# Altium footprint library ref-packages.PCBLIB: 1543 footprints (part 96 of 103) (continued)
## TQFP100 [mm]
pads (100):
  rect 0.27x1.5 smd: 1(-6,-7.75) 2(-5.5,-7.75) 3(-5,-7.75) 4(-4.5,-7.75) 5(-4,-7.75) 6(-3.5,-7.75) 7(-3,-7.75) 8(-2.5,-7.75) 9(-2,-7.75) 10(-1.5,-7.75) 11(-1,-7.75) 12(-0.5,-7.75) 13(0,-7.75) 14(0.5,-7.75) 15(1,-7.75) 16(1.5,-7.75) 17(2,-7.75) 18(2.5,-7.75) 19(3,-7.75) 20(3.5,-7.75) 21(4,-7.75) 22(4.5,-7.75) 23(5,-7.75) 24(5.5,-7.75) 25(6,-7.75) 51(6,7.75) 52(5.5,7.75) 53(5,7.75) 54(4.5,7.75) 55(4,7.75) 56(3.5,7.75) 57(3,7.75) 58(2.5,7.75) 59(2,7.75) 60(1.5,7.75) 61(1,7.75) 62(0.5,7.75) 63(0,7.75) 64(-0.5,7.75) 65(-1,7.75) 66(-1.5,7.75) 67(-2,7.75) 68(-2.5,7.75) 69(-3,7.75) 70(-3.5,7.75) 71(-4,7.75) 72(-4.5,7.75) 73(-5,7.75) 74(-5.5,7.75) 75(-6,7.75)
  rect 1.5x0.27 smd: 26(7.75,-6) 27(7.75,-5.5) 28(7.75,-5) 29(7.75,-4.5) 30(7.75,-4) 31(7.75,-3.5) 32(7.75,-3) 33(7.75,-2.5) 34(7.75,-2) 35(7.75,-1.5) 36(7.75,-1) 37(7.75,-0.5) 38(7.75,0) 39(7.75,0.5) 40(7.75,1) 41(7.75,1.5) 42(7.75,2) 43(7.75,2.5) 44(7.75,3) 45(7.75,3.5) 46(7.75,4) 47(7.75,4.5) 48(7.75,5) 49(7.75,5.5) 50(7.75,6) 76(-7.75,6) 77(-7.75,5.5) 78(-7.75,5) 79(-7.75,4.5) 80(-7.75,4) 81(-7.75,3.5) 82(-7.75,3) 83(-7.75,2.5) 84(-7.75,2) 85(-7.75,1.5) 86(-7.75,1) 87(-7.75,0.5) 88(-7.75,0) 89(-7.75,-0.5) 90(-7.75,-1) 91(-7.75,-1.5) 92(-7.75,-2) 93(-7.75,-2.5) 94(-7.75,-3) 95(-7.75,-3.5) 96(-7.75,-4) 97(-7.75,-4.5) 98(-7.75,-5) 99(-7.75,-5.5) 100(-7.75,-6)
Top Overlay:
  circle w0.152: c-4.5,-4.5 r1
  lines w0.152: -6.873,-6.123 -6.123,-6.873 6.873,-6.873 6.873,6.873 -6.873,6.873 -6.873,-6.123
Mechanical 16:
  rectangle: -6.135,6.868 -5.865,7.873
  rectangle: -5.635,6.868 -5.365,7.873
  rectangle: -5.135,6.868 -4.865,7.873
  rectangle: -4.635,6.868 -4.365,7.873
  rectangle: -4.135,6.868 -3.865,7.873
  rectangle: -3.635,6.868 -3.365,7.873
  rectangle: -3.135,6.868 -2.865,7.873
  rectangle: -2.635,6.868 -2.365,7.873
  rectangle: -2.135,6.868 -1.865,7.873
  rectangle: -1.635,6.868 -1.365,7.873
  rectangle: -1.135,6.868 -0.865,7.873
  rectangle: -0.635,6.868 -0.365,7.873
  rectangle: -0.135,6.868 0.135,7.873
  rectangle: 0.365,6.868 0.635,7.873
  rectangle: 0.865,6.868 1.135,7.873
  rectangle: 1.365,6.868 1.635,7.873
  rectangle: 1.865,6.868 2.135,7.873
  rectangle: 2.365,6.868 2.635,7.873
  rectangle: 2.865,6.868 3.135,7.873
  rectangle: 3.365,6.868 3.635,7.873
  rectangle: 3.865,6.868 4.135,7.873
  rectangle: 4.365,6.868 4.635,7.873
  rectangle: 4.865,6.868 5.135,7.873
  rectangle: 5.365,6.868 5.635,7.873
  rectangle: 5.865,6.868 6.135,7.873
  rectangle: 6.873,5.865 7.878,6.135
  rectangle: 6.873,5.365 7.878,5.635
  rectangle: 6.873,4.865 7.878,5.135
  rectangle: 6.873,4.365 7.878,4.635
  rectangle: 6.873,3.865 7.878,4.135
  rectangle: 6.873,3.365 7.878,3.635
  rectangle: 6.873,2.865 7.878,3.135
  rectangle: 6.873,2.365 7.878,2.635
  rectangle: 6.873,1.865 7.878,2.135
  rectangle: 6.873,1.365 7.878,1.635
  rectangle: 6.873,0.865 7.878,1.135
  rectangle: 6.873,0.365 7.878,0.635
  rectangle: 6.873,-0.135 7.878,0.135
  rectangle: 6.873,-0.635 7.878,-0.365
  rectangle: 6.873,-1.135 7.878,-0.865
  rectangle: 6.873,-1.635 7.878,-1.365
  rectangle: 6.873,-2.135 7.878,-1.865
  rectangle: 6.873,-2.635 7.878,-2.365
  rectangle: 6.873,-3.135 7.878,-2.865
  rectangle: 6.873,-3.635 7.878,-3.365
  rectangle: 6.873,-4.135 7.878,-3.865
  rectangle: 6.873,-4.635 7.878,-4.365
  rectangle: 6.873,-5.135 7.878,-4.865
  rectangle: 6.873,-5.635 7.878,-5.365
  rectangle: 6.873,-6.135 7.878,-5.865
  rectangle: 5.865,-7.873 6.135,-6.868
  rectangle: 5.365,-7.873 5.635,-6.868
  rectangle: 4.865,-7.873 5.135,-6.868
  rectangle: 4.365,-7.873 4.635,-6.868
  rectangle: 3.865,-7.873 4.135,-6.868
  rectangle: 3.365,-7.873 3.635,-6.868
  rectangle: 2.865,-7.873 3.135,-6.868
  rectangle: 2.365,-7.873 2.635,-6.868
  rectangle: 1.865,-7.873 2.135,-6.868
  rectangle: 1.365,-7.873 1.635,-6.868
  rectangle: 0.865,-7.873 1.135,-6.868
  rectangle: 0.365,-7.873 0.635,-6.868
  rectangle: -0.135,-7.873 0.135,-6.868
  rectangle: -0.635,-7.873 -0.365,-6.868
  rectangle: -1.135,-7.873 -0.865,-6.868
  rectangle: -1.635,-7.873 -1.365,-6.868
  rectangle: -2.135,-7.873 -1.865,-6.868
  rectangle: -2.635,-7.873 -2.365,-6.868
  rectangle: -3.135,-7.873 -2.865,-6.868
  rectangle: -3.635,-7.873 -3.365,-6.868
  rectangle: -4.135,-7.873 -3.865,-6.868
  rectangle: -4.635,-7.873 -4.365,-6.868
  rectangle: -5.135,-7.873 -4.865,-6.868
  rectangle: -5.635,-7.873 -5.365,-6.868
  rectangle: -6.135,-7.873 -5.865,-6.868
  rectangle: -7.878,-6.135 -6.873,-5.865
  rectangle: -7.878,-5.635 -6.873,-5.365
  rectangle: -7.878,-5.135 -6.873,-4.865
  rectangle: -7.878,-4.635 -6.873,-4.365
  rectangle: -7.878,-4.135 -6.873,-3.865
  rectangle: -7.878,-3.635 -6.873,-3.365
  rectangle: -7.878,-3.135 -6.873,-2.865
  rectangle: -7.878,-2.635 -6.873,-2.365
  rectangle: -7.878,-2.135 -6.873,-1.865
  rectangle: -7.878,-1.635 -6.873,-1.365
  rectangle: -7.878,-1.135 -6.873,-0.865
  rectangle: -7.878,-0.635 -6.873,-0.365
  rectangle: -7.878,-0.135 -6.873,0.135
  rectangle: -7.878,0.365 -6.873,0.635
  rectangle: -7.878,0.865 -6.873,1.135
  rectangle: -7.878,1.365 -6.873,1.635
  rectangle: -7.878,1.865 -6.873,2.135
  rectangle: -7.878,2.365 -6.873,2.635
  rectangle: -7.878,2.865 -6.873,3.135
  rectangle: -7.878,3.365 -6.873,3.635
  rectangle: -7.878,3.865 -6.873,4.135
  rectangle: -7.878,4.365 -6.873,4.635
  rectangle: -7.878,4.865 -6.873,5.135
  rectangle: -7.878,5.365 -6.873,5.635
  rectangle: -7.878,5.865 -6.873,6.135

## TQFP112 [mm]
pads (112):
  rect 1.5x0.37 smd: 1(-10.75,8.775) 2(-10.75,8.125) 3(-10.75,7.475) 4(-10.75,6.825) 5(-10.75,6.175) 6(-10.75,5.525) 7(-10.75,4.875) 8(-10.75,4.225) 9(-10.75,3.575) 10(-10.75,2.925) 11(-10.75,2.275) 12(-10.75,1.625) 13(-10.75,0.975) 14(-10.75,0.325) 15(-10.75,-0.325) 16(-10.75,-0.975) 17(-10.75,-1.625) 18(-10.75,-2.275) 19(-10.75,-2.925) 20(-10.75,-3.575) 21(-10.75,-4.225) 22(-10.75,-4.875) 23(-10.75,-5.525) 24(-10.75,-6.175) 25(-10.75,-6.825) 26(-10.75,-7.475) 27(-10.75,-8.125) 28(-10.75,-8.775) 57(10.75,-8.775) 58(10.75,-8.125) 59(10.75,-7.475) 60(10.75,-6.825) 61(10.75,-6.175) 62(10.75,-5.525) 63(10.75,-4.875) 64(10.75,-4.225) 65(10.75,-3.575) 66(10.75,-2.925) 67(10.75,-2.275) 68(10.75,-1.625) 69(10.75,-0.975) 70(10.75,-0.325) 71(10.75,0.325) 72(10.75,0.975) 73(10.75,1.625) 74(10.75,2.275) 75(10.75,2.925) 76(10.75,3.575) 77(10.75,4.225) 78(10.75,4.875) 79(10.75,5.525) 80(10.75,6.175) 81(10.75,6.825) 82(10.75,7.475) 83(10.75,8.125) 84(10.75,8.775)
  rect 0.37x1.5 smd: 29(-8.775,-10.75) 30(-8.125,-10.75) 31(-7.475,-10.75) 32(-6.825,-10.75) 33(-6.175,-10.75) 34(-5.525,-10.75) 35(-4.875,-10.75) 36(-4.225,-10.75) 37(-3.575,-10.75) 38(-2.925,-10.75) 39(-2.275,-10.75) 40(-1.625,-10.75) 41(-0.975,-10.75) 42(-0.325,-10.75) 43(0.325,-10.75) 44(0.975,-10.75) 45(1.625,-10.75) 46(2.275,-10.75) 47(2.925,-10.75) 48(3.575,-10.75) 49(4.225,-10.75) 50(4.875,-10.75) 51(5.525,-10.75) 52(6.175,-10.75) 53(6.825,-10.75) 54(7.475,-10.75) 55(8.125,-10.75) 56(8.775,-10.75) 85(8.775,10.75) 86(8.125,10.75) 87(7.475,10.75) 88(6.825,10.75) 89(6.175,10.75) 90(5.525,10.75) 91(4.875,10.75) 92(4.225,10.75) 93(3.575,10.75) 94(2.925,10.75) 95(2.275,10.75) 96(1.625,10.75) 97(0.975,10.75) 98(0.325,10.75) 99(-0.325,10.75) 100(-0.975,10.75) 101(-1.625,10.75) 102(-2.275,10.75) 103(-2.925,10.75) 104(-3.575,10.75) 105(-4.225,10.75) 106(-4.875,10.75) 107(-5.525,10.75) 108(-6.175,10.75) 109(-6.825,10.75) 110(-7.475,10.75) 111(-8.125,10.75) 112(-8.775,10.75)
Top Overlay:
  circle w0.203: c-8.5,8.4 r0.6
  lines w0.203: -9.8,-9.4 -9.8,9.4 -9.4,9.8 9.4,9.8 9.8,9.4 9.8,-9.4 9.4,-9.8 -9.4,-9.8 -9.8,-9.4
Mechanical 16:
  rectangle: -11.05,8.612 -9.88,8.937
  rectangle: -11.05,7.962 -9.88,8.288
  rectangle: -11.05,7.312 -9.88,7.638
  rectangle: -11.05,6.662 -9.88,6.988
  rectangle: -11.05,6.012 -9.88,6.338
  rectangle: -11.05,5.362 -9.88,5.688
  rectangle: -11.05,4.712 -9.88,5.038
  rectangle: -11.05,4.062 -9.88,4.388
  rectangle: -11.05,3.412 -9.88,3.738
  rectangle: -11.05,2.763 -9.88,3.088
  rectangle: -11.05,2.113 -9.88,2.437
  rectangle: -11.05,1.463 -9.88,1.787
  rectangle: -11.05,0.813 -9.88,1.137
  rectangle: -11.05,0.163 -9.88,0.487
  rectangle: -11.05,-0.487 -9.88,-0.163
  rectangle: -11.05,-1.137 -9.88,-0.813
  rectangle: -11.05,-1.787 -9.88,-1.463
  rectangle: -11.05,-2.437 -9.88,-2.113
  rectangle: -11.05,-3.088 -9.88,-2.763
  rectangle: -11.05,-3.738 -9.88,-3.412
  rectangle: -11.05,-4.388 -9.88,-4.062
  rectangle: -11.05,-5.038 -9.88,-4.712
  rectangle: -11.05,-5.688 -9.88,-5.362
  rectangle: -11.05,-6.338 -9.88,-6.012
  rectangle: -11.05,-6.988 -9.88,-6.662
  rectangle: -11.05,-7.638 -9.88,-7.312
  rectangle: -11.05,-8.288 -9.88,-7.962
  rectangle: -11.05,-8.937 -9.88,-8.612
  rectangle: -8.937,-11.05 -8.612,-9.88
  rectangle: -8.288,-11.05 -7.962,-9.88
  rectangle: -7.638,-11.05 -7.312,-9.88
  rectangle: -6.988,-11.05 -6.662,-9.88
  rectangle: -6.338,-11.05 -6.012,-9.88
  rectangle: -5.688,-11.05 -5.362,-9.88
  rectangle: -5.038,-11.05 -4.712,-9.88
  rectangle: -4.388,-11.05 -4.062,-9.88
  rectangle: -3.738,-11.05 -3.412,-9.88
  rectangle: -3.088,-11.05 -2.763,-9.88
  rectangle: -2.437,-11.05 -2.113,-9.88
  rectangle: -1.787,-11.05 -1.463,-9.88
  rectangle: -1.137,-11.05 -0.813,-9.88
  rectangle: -0.487,-11.05 -0.163,-9.88
  rectangle: 0.163,-11.05 0.487,-9.88
  rectangle: 0.813,-11.05 1.137,-9.88
  rectangle: 1.463,-11.05 1.787,-9.88
  rectangle: 2.113,-11.05 2.437,-9.88
  rectangle: 2.763,-11.05 3.088,-9.88
  rectangle: 3.412,-11.05 3.738,-9.88
  rectangle: 4.062,-11.05 4.388,-9.88
  rectangle: 4.712,-11.05 5.038,-9.88
  rectangle: 5.362,-11.05 5.688,-9.88
  rectangle: 6.012,-11.05 6.338,-9.88
  rectangle: 6.662,-11.05 6.988,-9.88
  rectangle: 7.312,-11.05 7.638,-9.88
  rectangle: 7.962,-11.05 8.288,-9.88
  rectangle: 8.612,-11.05 8.937,-9.88
  rectangle: 9.88,-8.937 11.05,-8.612
  rectangle: 9.88,-8.288 11.05,-7.962
  rectangle: 9.88,-7.638 11.05,-7.312
  rectangle: 9.88,-6.988 11.05,-6.662
  rectangle: 9.88,-6.338 11.05,-6.012
  rectangle: 9.88,-5.688 11.05,-5.362
  rectangle: 9.88,-5.038 11.05,-4.712
  rectangle: 9.88,-4.388 11.05,-4.062
  rectangle: 9.88,-3.738 11.05,-3.412
  rectangle: 9.88,-3.088 11.05,-2.763
  rectangle: 9.88,-2.437 11.05,-2.113
  rectangle: 9.88,-1.787 11.05,-1.463
  rectangle: 9.88,-1.137 11.05,-0.813
  rectangle: 9.88,-0.487 11.05,-0.163
  rectangle: 9.88,0.163 11.05,0.487
  rectangle: 9.88,0.813 11.05,1.137
  rectangle: 9.88,1.463 11.05,1.787
  rectangle: 9.88,2.113 11.05,2.437
  rectangle: 9.88,2.763 11.05,3.088
  rectangle: 9.88,3.412 11.05,3.738
  rectangle: 9.88,4.062 11.05,4.388
  rectangle: 9.88,4.712 11.05,5.038
  rectangle: 9.88,5.362 11.05,5.688
  rectangle: 9.88,6.012 11.05,6.338
  rectangle: 9.88,6.662 11.05,6.988
  rectangle: 9.88,7.312 11.05,7.638
  rectangle: 9.88,7.962 11.05,8.288
  rectangle: 9.88,8.612 11.05,8.937
  rectangle: 8.612,9.88 8.937,11.05
  rectangle: 7.962,9.88 8.288,11.05
  rectangle: 7.312,9.88 7.638,11.05
  rectangle: 6.662,9.88 6.988,11.05
  rectangle: 6.012,9.88 6.338,11.05
  rectangle: 5.362,9.88 5.688,11.05
  rectangle: 4.712,9.88 5.038,11.05
  rectangle: 4.062,9.88 4.388,11.05
  rectangle: 3.412,9.88 3.738,11.05
  rectangle: 2.763,9.88 3.088,11.05
  rectangle: 2.113,9.88 2.437,11.05
  rectangle: 1.463,9.88 1.787,11.05
  rectangle: 0.813,9.88 1.137,11.05
  rectangle: 0.163,9.88 0.487,11.05
  rectangle: -0.487,9.88 -0.163,11.05
  rectangle: -1.137,9.88 -0.813,11.05
  rectangle: -1.787,9.88 -1.463,11.05
  rectangle: -2.437,9.88 -2.113,11.05
  rectangle: -3.088,9.88 -2.763,11.05
  rectangle: -3.738,9.88 -3.412,11.05
  rectangle: -4.388,9.88 -4.062,11.05
  rectangle: -5.038,9.88 -4.712,11.05
  rectangle: -5.688,9.88 -5.362,11.05
  rectangle: -6.338,9.88 -6.012,11.05
  rectangle: -6.988,9.88 -6.662,11.05
  rectangle: -7.638,9.88 -7.312,11.05
  rectangle: -8.288,9.88 -7.962,11.05
  rectangle: -8.937,9.88 -8.612,11.05

## TQFP128 [mm]
pads (128):
  rect 0.27x1.5 smd: 1(-7.75,-10.75) 2(-7.25,-10.75) 3(-6.75,-10.75) 4(-6.25,-10.75) 5(-5.75,-10.75) 6(-5.25,-10.75) 7(-4.75,-10.75) 8(-4.25,-10.75) 9(-3.75,-10.75) 10(-3.25,-10.75) 11(-2.75,-10.75) 12(-2.25,-10.75) 13(-1.75,-10.75) 14(-1.25,-10.75) 15(-0.75,-10.75) 16(-0.25,-10.75) 17(0.25,-10.75) 18(0.75,-10.75) 19(1.25,-10.75) 20(1.75,-10.75) 21(2.25,-10.75) 22(2.75,-10.75) 23(3.25,-10.75) 24(3.75,-10.75) 25(4.25,-10.75) 26(4.75,-10.75) 27(5.25,-10.75) 28(5.75,-10.75) 29(6.25,-10.75) 30(6.75,-10.75) 31(7.25,-10.75) 32(7.75,-10.75) 65(7.75,10.75) 66(7.25,10.75) 67(6.75,10.75) 68(6.25,10.75) 69(5.75,10.75) 70(5.25,10.75) 71(4.75,10.75) 72(4.25,10.75) 73(3.75,10.75) 74(3.25,10.75) 75(2.75,10.75) 76(2.25,10.75) 77(1.75,10.75) 78(1.25,10.75) 79(0.75,10.75) 80(0.25,10.75) 81(-0.25,10.75) 82(-0.75,10.75) 83(-1.25,10.75) 84(-1.75,10.75) 85(-2.25,10.75) 86(-2.75,10.75) 87(-3.25,10.75) 88(-3.75,10.75) 89(-4.25,10.75) 90(-4.75,10.75) 91(-5.25,10.75) 92(-5.75,10.75) 93(-6.25,10.75) 94(-6.75,10.75) 95(-7.25,10.75) 96(-7.75,10.75)
  rect 1.5x0.27 smd: 33(10.75,-7.75) 34(10.75,-7.25) 35(10.75,-6.75) 36(10.75,-6.25) 37(10.75,-5.75) 38(10.75,-5.25) 39(10.75,-4.75) 40(10.75,-4.25) 41(10.75,-3.75) 42(10.75,-3.25) 43(10.75,-2.75) 44(10.75,-2.25) 45(10.75,-1.75) 46(10.75,-1.25) 47(10.75,-0.75) 48(10.75,-0.25) 49(10.75,0.25) 50(10.75,0.75) 51(10.75,1.25) 52(10.75,1.75) 53(10.75,2.25) 54(10.75,2.75) 55(10.75,3.25) 56(10.75,3.75) 57(10.75,4.25) 58(10.75,4.75) 59(10.75,5.25) 60(10.75,5.75) 61(10.75,6.25) 62(10.75,6.75) 63(10.75,7.25) 64(10.75,7.75) 97(-10.75,7.75) 98(-10.75,7.25) 99(-10.75,6.75) 100(-10.75,6.25) 101(-10.75,5.75) 102(-10.75,5.25) 103(-10.75,4.75) 104(-10.75,4.25) 105(-10.75,3.75) 106(-10.75,3.25) 107(-10.75,2.75) 108(-10.75,2.25) 109(-10.75,1.75) 110(-10.75,1.25) 111(-10.75,0.75) 112(-10.75,0.25) 113(-10.75,-0.25) 114(-10.75,-0.75) 115(-10.75,-1.25) 116(-10.75,-1.75) 117(-10.75,-2.25) 118(-10.75,-2.75) 119(-10.75,-3.25) 120(-10.75,-3.75) 121(-10.75,-4.25) 122(-10.75,-4.75) 123(-10.75,-5.25) 124(-10.75,-5.75) 125(-10.75,-6.25) 126(-10.75,-6.75) 127(-10.75,-7.25) 128(-10.75,-7.75)
Top Overlay:
  circle w0.152: c-7.5,-7.5 r1
  lines w0.152: -9.873,-8.873 -8.873,-9.873 9.873,-9.873 9.873,9.873 -9.873,9.873 -9.873,-8.873
Mechanical 16:
  rectangle: -7.885,9.868 -7.61,10.873
  rectangle: -7.385,9.868 -7.11,10.873
  rectangle: -6.885,9.868 -6.61,10.873
  rectangle: -6.385,9.868 -6.11,10.873
  rectangle: -5.885,9.868 -5.61,10.873
  rectangle: -5.385,9.868 -5.11,10.873
  rectangle: -4.885,9.868 -4.61,10.873
  rectangle: -4.385,9.868 -4.11,10.873
  rectangle: -3.885,9.868 -3.61,10.873
  rectangle: -3.385,9.868 -3.11,10.873
  rectangle: -2.885,9.868 -2.61,10.873
  rectangle: -2.385,9.868 -2.11,10.873
  rectangle: -1.885,9.868 -1.61,10.873
  rectangle: -1.385,9.868 -1.11,10.873
  rectangle: -0.885,9.868 -0.61,10.873
  rectangle: -0.385,9.868 -0.11,10.873
  rectangle: 0.115,9.868 0.39,10.873
  rectangle: 0.615,9.868 0.89,10.873
  rectangle: 1.115,9.868 1.39,10.873
  rectangle: 1.615,9.868 1.89,10.873
  rectangle: 2.115,9.868 2.39,10.873
  rectangle: 2.615,9.868 2.89,10.873
  rectangle: 3.115,9.868 3.39,10.873
  rectangle: 3.615,9.868 3.89,10.873
  rectangle: 4.115,9.868 4.39,10.873
  rectangle: 4.615,9.868 4.89,10.873
  rectangle: 5.115,9.868 5.39,10.873
  rectangle: 5.615,9.868 5.89,10.873
  rectangle: 6.115,9.868 6.39,10.873
  rectangle: 6.615,9.868 6.89,10.873
  rectangle: 7.115,9.868 7.39,10.873
  rectangle: 7.615,9.868 7.89,10.873
  rectangle: 9.873,7.615 10.878,7.89
  rectangle: 9.873,7.115 10.878,7.39
  rectangle: 9.873,6.615 10.878,6.89
  rectangle: 9.873,6.115 10.878,6.39
  rectangle: 9.873,5.615 10.878,5.89
  rectangle: 9.873,5.115 10.878,5.39
  rectangle: 9.873,4.615 10.878,4.89
  rectangle: 9.873,4.115 10.878,4.39
  rectangle: 9.873,3.615 10.878,3.89
  rectangle: 9.873,3.115 10.878,3.39
  rectangle: 9.873,2.615 10.878,2.89
  rectangle: 9.873,2.115 10.878,2.39
  rectangle: 9.873,1.615 10.878,1.89
  rectangle: 9.873,1.115 10.878,1.39
  rectangle: 9.873,0.615 10.878,0.89
  rectangle: 9.873,0.115 10.878,0.39
  rectangle: 9.873,-0.385 10.878,-0.11
  rectangle: 9.873,-0.885 10.878,-0.61
  rectangle: 9.873,-1.385 10.878,-1.11
  rectangle: 9.873,-1.885 10.878,-1.61
  rectangle: 9.873,-2.385 10.878,-2.11
  rectangle: 9.873,-2.885 10.878,-2.61
  rectangle: 9.873,-3.385 10.878,-3.11
  rectangle: 9.873,-3.885 10.878,-3.61
  rectangle: 9.873,-4.385 10.878,-4.11
  rectangle: 9.873,-4.885 10.878,-4.61
  rectangle: 9.873,-5.385 10.878,-5.11
  rectangle: 9.873,-5.885 10.878,-5.61
  rectangle: 9.873,-6.385 10.878,-6.11
  rectangle: 9.873,-6.885 10.878,-6.61
  rectangle: 9.873,-7.385 10.878,-7.11
  rectangle: 9.873,-7.885 10.878,-7.61
  rectangle: -10.873,7.615 -9.868,7.89
  rectangle: -10.873,7.115 -9.868,7.39
  rectangle: -10.873,6.615 -9.868,6.89
  rectangle: -10.873,6.115 -9.868,6.39
  rectangle: -10.873,5.615 -9.868,5.89
  rectangle: -10.873,5.115 -9.868,5.39
  rectangle: -10.873,4.615 -9.868,4.89
  rectangle: -10.873,4.115 -9.868,4.39
  rectangle: -10.873,3.615 -9.868,3.89
  rectangle: -10.873,3.115 -9.868,3.39
  rectangle: -10.873,2.615 -9.868,2.89
  rectangle: -10.873,2.115 -9.868,2.39
  rectangle: -10.873,1.615 -9.868,1.89
  rectangle: -10.873,1.115 -9.868,1.39
  rectangle: -10.873,0.615 -9.868,0.89
  rectangle: -10.873,0.115 -9.868,0.39
  rectangle: -10.873,-0.385 -9.868,-0.11
  rectangle: -10.873,-0.885 -9.868,-0.61
  rectangle: -10.873,-1.385 -9.868,-1.11
  rectangle: -10.873,-1.885 -9.868,-1.61
  rectangle: -10.873,-2.385 -9.868,-2.11
  rectangle: -10.873,-2.885 -9.868,-2.61
  rectangle: -10.873,-3.385 -9.868,-3.11
  rectangle: -10.873,-3.885 -9.868,-3.61
  rectangle: -10.873,-4.385 -9.868,-4.11
  rectangle: -10.873,-4.885 -9.868,-4.61
  rectangle: -10.873,-5.385 -9.868,-5.11
  rectangle: -10.873,-5.885 -9.868,-5.61
  rectangle: -10.873,-6.385 -9.868,-6.11
  rectangle: -10.873,-6.885 -9.868,-6.61
  rectangle: -10.873,-7.385 -9.868,-7.11
  rectangle: -10.873,-7.885 -9.868,-7.61
  rectangle: -7.89,-10.873 -7.615,-9.868
  rectangle: -7.39,-10.873 -7.115,-9.868
  rectangle: -6.89,-10.873 -6.615,-9.868
  rectangle: -6.39,-10.873 -6.115,-9.868
  rectangle: -5.89,-10.873 -5.615,-9.868
  rectangle: -5.39,-10.873 -5.115,-9.868
  rectangle: -4.89,-10.873 -4.615,-9.868
  rectangle: -4.39,-10.873 -4.115,-9.868
  rectangle: -3.89,-10.873 -3.615,-9.868
  rectangle: -3.39,-10.873 -3.115,-9.868
  rectangle: -2.89,-10.873 -2.615,-9.868
  rectangle: -2.39,-10.873 -2.115,-9.868
  rectangle: -1.89,-10.873 -1.615,-9.868
  rectangle: -1.39,-10.873 -1.115,-9.868
  rectangle: -0.89,-10.873 -0.615,-9.868
  rectangle: -0.39,-10.873 -0.115,-9.868
  rectangle: 0.11,-10.873 0.385,-9.868
  rectangle: 0.61,-10.873 0.885,-9.868
  rectangle: 1.11,-10.873 1.385,-9.868
  rectangle: 1.61,-10.873 1.885,-9.868
  rectangle: 2.11,-10.873 2.385,-9.868
  rectangle: 2.61,-10.873 2.885,-9.868
  rectangle: 3.11,-10.873 3.385,-9.868
  rectangle: 3.61,-10.873 3.885,-9.868
  rectangle: 4.11,-10.873 4.385,-9.868
  rectangle: 4.61,-10.873 4.885,-9.868
  rectangle: 5.11,-10.873 5.385,-9.868
  rectangle: 5.61,-10.873 5.885,-9.868
  rectangle: 6.11,-10.873 6.385,-9.868
  rectangle: 6.61,-10.873 6.885,-9.868
  rectangle: 7.11,-10.873 7.385,-9.868
  rectangle: 7.61,-10.873 7.885,-9.868

## TQFP144 [mm]
pads (144):
  rect 0.27x1.5 smd: 1(-8.75,-10.75) 2(-8.25,-10.75) 3(-7.75,-10.75) 4(-7.25,-10.75) 5(-6.75,-10.75) 6(-6.25,-10.75) 7(-5.75,-10.75) 8(-5.25,-10.75) 9(-4.75,-10.75) 10(-4.25,-10.75) 11(-3.75,-10.75) 12(-3.25,-10.75) 13(-2.75,-10.75) 14(-2.25,-10.75) 15(-1.75,-10.75) 16(-1.25,-10.75) 17(-0.75,-10.75) 18(-0.25,-10.75) 19(0.25,-10.75) 20(0.75,-10.75) 21(1.25,-10.75) 22(1.75,-10.75) 23(2.25,-10.75) 24(2.75,-10.75) 25(3.25,-10.75) 26(3.75,-10.75) 27(4.25,-10.75) 28(4.75,-10.75) 29(5.25,-10.75) 30(5.75,-10.75) 31(6.25,-10.75) 32(6.75,-10.75) 33(7.25,-10.75) 34(7.75,-10.75) 35(8.25,-10.75) 36(8.75,-10.75) 73(8.75,10.75) 74(8.25,10.75) 75(7.75,10.75) 76(7.25,10.75) 77(6.75,10.75) 78(6.25,10.75) 79(5.75,10.75) 80(5.25,10.75) 81(4.75,10.75) 82(4.25,10.75) 83(3.75,10.75) 84(3.25,10.75) 85(2.75,10.75) 86(2.25,10.75) 87(1.75,10.75) 88(1.25,10.75) 89(0.75,10.75) 90(0.25,10.75) 91(-0.25,10.75) 92(-0.75,10.75) 93(-1.25,10.75) 94(-1.75,10.75) 95(-2.25,10.75) 96(-2.75,10.75) 97(-3.25,10.75) 98(-3.75,10.75) 99(-4.25,10.75) 100(-4.75,10.75) 101(-5.25,10.75) 102(-5.75,10.75) 103(-6.25,10.75) 104(-6.75,10.75) 105(-7.25,10.75) 106(-7.75,10.75) 107(-8.25,10.75) 108(-8.75,10.75)
  rect 1.5x0.27 smd: 37(10.75,-8.75) 38(10.75,-8.25) 39(10.75,-7.75) 40(10.75,-7.25) 41(10.75,-6.75) 42(10.75,-6.25) 43(10.75,-5.75) 44(10.75,-5.25) 45(10.75,-4.75) 46(10.75,-4.25) 47(10.75,-3.75) 48(10.75,-3.25) 49(10.75,-2.75) 50(10.75,-2.25) 51(10.75,-1.75) 52(10.75,-1.25) 53(10.75,-0.75) 54(10.75,-0.25) 55(10.75,0.25) 56(10.75,0.75) 57(10.75,1.25) 58(10.75,1.75) 59(10.75,2.25) 60(10.75,2.75) 61(10.75,3.25) 62(10.75,3.75) 63(10.75,4.25) 64(10.75,4.75) 65(10.75,5.25) 66(10.75,5.75) 67(10.75,6.25) 68(10.75,6.75) 69(10.75,7.25) 70(10.75,7.75) 71(10.75,8.25) 72(10.75,8.75) 109(-10.75,8.75) 110(-10.75,8.25) 111(-10.75,7.75) 112(-10.75,7.25) 113(-10.75,6.75) 114(-10.75,6.25) 115(-10.75,5.75) 116(-10.75,5.25) 117(-10.75,4.75) 118(-10.75,4.25) 119(-10.75,3.75) 120(-10.75,3.25) 121(-10.75,2.75) 122(-10.75,2.25) 123(-10.75,1.75) 124(-10.75,1.25) 125(-10.75,0.75) 126(-10.75,0.25) 127(-10.75,-0.25) 128(-10.75,-0.75) 129(-10.75,-1.25) 130(-10.75,-1.75) 131(-10.75,-2.25) 132(-10.75,-2.75) 133(-10.75,-3.25) 134(-10.75,-3.75) 135(-10.75,-4.25) 136(-10.75,-4.75) 137(-10.75,-5.25) 138(-10.75,-5.75) 139(-10.75,-6.25) 140(-10.75,-6.75) 141(-10.75,-7.25) 142(-10.75,-7.75) 143(-10.75,-8.25) 144(-10.75,-8.75)
Top Overlay:
  circle w0.152: c-8,-8 r1
  lines w0.152: -9.873,-9.123 -9.123,-9.873 9.873,-9.873 9.873,9.873 -9.873,9.873 -9.873,-9.123
Mechanical 16:
  rectangle: -8.885,9.87 -8.615,10.873
  rectangle: -8.385,9.87 -8.115,10.873
  rectangle: -7.885,9.87 -7.615,10.873
  rectangle: -7.385,9.87 -7.115,10.873
  rectangle: -6.885,9.87 -6.615,10.873
  rectangle: -6.385,9.87 -6.115,10.873
  rectangle: -5.885,9.87 -5.615,10.873
  rectangle: -5.385,9.87 -5.115,10.873
  rectangle: -4.885,9.87 -4.615,10.873
  rectangle: -4.385,9.87 -4.115,10.873
  rectangle: -3.885,9.87 -3.615,10.873
  rectangle: -3.385,9.87 -3.115,10.873
  rectangle: -2.885,9.87 -2.615,10.873
  rectangle: -2.385,9.87 -2.115,10.873
  rectangle: -1.885,9.87 -1.615,10.873
  rectangle: -1.385,9.87 -1.115,10.873
  rectangle: -0.885,9.87 -0.615,10.873
  rectangle: -0.385,9.87 -0.115,10.873
  rectangle: 0.115,9.87 0.385,10.873
  rectangle: 0.615,9.87 0.885,10.873
  rectangle: 1.115,9.87 1.385,10.873
  rectangle: 1.615,9.87 1.885,10.873
  rectangle: 2.115,9.87 2.385,10.873
  rectangle: 2.615,9.87 2.885,10.873
  rectangle: 3.115,9.87 3.385,10.873
  rectangle: 3.615,9.87 3.885,10.873
  rectangle: 4.115,9.87 4.385,10.873
  rectangle: 4.615,9.87 4.885,10.873
  rectangle: 5.115,9.87 5.385,10.873
  rectangle: 5.615,9.87 5.885,10.873
  rectangle: 6.115,9.87 6.385,10.873
  rectangle: 6.615,9.87 6.885,10.873
  rectangle: 7.115,9.87 7.385,10.873
  rectangle: 7.615,9.87 7.885,10.873
  rectangle: 8.115,9.87 8.385,10.873
  rectangle: 8.615,9.87 8.885,10.873
  rectangle: -8.885,-10.876 -8.615,-9.873
  rectangle: -8.385,-10.876 -8.115,-9.873
  rectangle: -7.885,-10.876 -7.615,-9.873
  rectangle: -7.385,-10.876 -7.115,-9.873
  rectangle: -6.885,-10.876 -6.615,-9.873
  rectangle: -6.385,-10.876 -6.115,-9.873
  rectangle: -5.885,-10.876 -5.615,-9.873
  rectangle: -5.385,-10.876 -5.115,-9.873
  rectangle: -4.885,-10.876 -4.615,-9.873
  rectangle: -4.385,-10.876 -4.115,-9.873
  rectangle: -3.885,-10.876 -3.615,-9.873
  rectangle: -3.385,-10.876 -3.115,-9.873
  rectangle: -2.885,-10.876 -2.615,-9.873
  rectangle: -2.385,-10.876 -2.115,-9.873
  rectangle: -1.885,-10.876 -1.615,-9.873
  rectangle: -1.385,-10.876 -1.115,-9.873
  rectangle: -0.885,-10.876 -0.615,-9.873
  rectangle: -0.385,-10.876 -0.115,-9.873
  rectangle: 0.115,-10.876 0.385,-9.873
  rectangle: 0.615,-10.876 0.885,-9.873
  rectangle: 1.115,-10.876 1.385,-9.873
  rectangle: 1.615,-10.876 1.885,-9.873
  rectangle: 2.115,-10.876 2.385,-9.873
  rectangle: 2.615,-10.876 2.885,-9.873
  rectangle: 3.115,-10.876 3.385,-9.873
  rectangle: 3.615,-10.876 3.885,-9.873
  rectangle: 4.115,-10.876 4.385,-9.873
  rectangle: 4.615,-10.876 4.885,-9.873
  rectangle: 5.115,-10.876 5.385,-9.873
  rectangle: 5.615,-10.876 5.885,-9.873
  rectangle: 6.115,-10.876 6.385,-9.873
  rectangle: 6.615,-10.876 6.885,-9.873
  rectangle: 7.115,-10.876 7.385,-9.873
  rectangle: 7.615,-10.876 7.885,-9.873
  rectangle: 8.115,-10.876 8.385,-9.873
  rectangle: 8.615,-10.876 8.885,-9.873
  rectangle: 9.873,-8.885 10.876,-8.615
  rectangle: 9.873,-8.385 10.876,-8.115
  rectangle: 9.873,-7.885 10.876,-7.615
  rectangle: 9.873,-7.385 10.876,-7.115
  rectangle: 9.873,-6.885 10.876,-6.615
  rectangle: 9.873,-6.385 10.876,-6.115
  rectangle: 9.873,-5.885 10.876,-5.615
  rectangle: 9.873,-5.385 10.876,-5.115
  rectangle: 9.873,-4.885 10.876,-4.615
  rectangle: 9.873,-4.385 10.876,-4.115
  rectangle: 9.873,-3.885 10.876,-3.615
  rectangle: 9.873,-3.385 10.876,-3.115
  rectangle: 9.873,-2.885 10.876,-2.615
  rectangle: 9.873,-2.385 10.876,-2.115
  rectangle: 9.873,-1.885 10.876,-1.615
  rectangle: 9.873,-1.385 10.876,-1.115
  rectangle: 9.873,-0.885 10.876,-0.615
  rectangle: 9.873,-0.385 10.876,-0.115
  rectangle: 9.873,0.115 10.876,0.385
  rectangle: 9.873,0.615 10.876,0.885
  rectangle: 9.873,1.115 10.876,1.385
  rectangle: 9.873,1.615 10.876,1.885
  rectangle: 9.873,2.115 10.876,2.385
  rectangle: 9.873,2.615 10.876,2.885
  rectangle: 9.873,3.115 10.876,3.385
  rectangle: 9.873,3.615 10.876,3.885
  rectangle: 9.873,4.115 10.876,4.385
  rectangle: 9.873,4.615 10.876,4.885
  rectangle: 9.873,5.115 10.876,5.385
  rectangle: 9.873,5.615 10.876,5.885
  rectangle: 9.873,6.115 10.876,6.385
  rectangle: 9.873,6.615 10.876,6.885
  rectangle: 9.873,7.115 10.876,7.385
  rectangle: 9.873,7.615 10.876,7.885
  rectangle: 9.873,8.115 10.876,8.385
  rectangle: 9.873,8.615 10.876,8.885
  rectangle: -10.873,-8.885 -9.87,-8.615
  rectangle: -10.873,-8.385 -9.87,-8.115
  rectangle: -10.873,-7.885 -9.87,-7.615
  rectangle: -10.873,-7.385 -9.87,-7.115
  rectangle: -10.873,-6.885 -9.87,-6.615
  rectangle: -10.873,-6.385 -9.87,-6.115
  rectangle: -10.873,-5.885 -9.87,-5.615
  rectangle: -10.873,-5.385 -9.87,-5.115
  rectangle: -10.873,-4.885 -9.87,-4.615
  rectangle: -10.873,-4.385 -9.87,-4.115
  rectangle: -10.873,-3.885 -9.87,-3.615
  rectangle: -10.873,-3.385 -9.87,-3.115
  rectangle: -10.873,-2.885 -9.87,-2.615
  rectangle: -10.873,-2.385 -9.87,-2.115
  rectangle: -10.873,-1.885 -9.87,-1.615
  rectangle: -10.873,-1.385 -9.87,-1.115
  rectangle: -10.873,-0.885 -9.87,-0.615
  rectangle: -10.873,-0.385 -9.87,-0.115
  rectangle: -10.873,0.115 -9.87,0.385
  rectangle: -10.873,0.615 -9.87,0.885
  rectangle: -10.873,1.115 -9.87,1.385
  rectangle: -10.873,1.615 -9.87,1.885
  rectangle: -10.873,2.115 -9.87,2.385
  rectangle: -10.873,2.615 -9.87,2.885
  rectangle: -10.873,3.115 -9.87,3.385
  rectangle: -10.873,3.615 -9.87,3.885
  rectangle: -10.873,4.115 -9.87,4.385
  rectangle: -10.873,4.615 -9.87,4.885
  rectangle: -10.873,5.115 -9.87,5.385
  rectangle: -10.873,5.615 -9.87,5.885
  rectangle: -10.873,6.115 -9.87,6.385
  rectangle: -10.873,6.615 -9.87,6.885
  rectangle: -10.873,7.115 -9.87,7.385
  rectangle: -10.873,7.615 -9.87,7.885
  rectangle: -10.873,8.115 -9.87,8.385
  rectangle: -10.873,8.615 -9.87,8.885